# Altium footprint library MotorDriver.PcbLib: 29 footprints (part 2 of 2)
Each footprint in its own frame and in the unit in brackets; x right, y up, seen from the top. Pads: shape width x height; smd on the part's side, far side on the other; paste and mask are expansions set on the pad; w line width, h text height; cw(c..) or ccw(c..) is an arc to the next point about the centre after c.
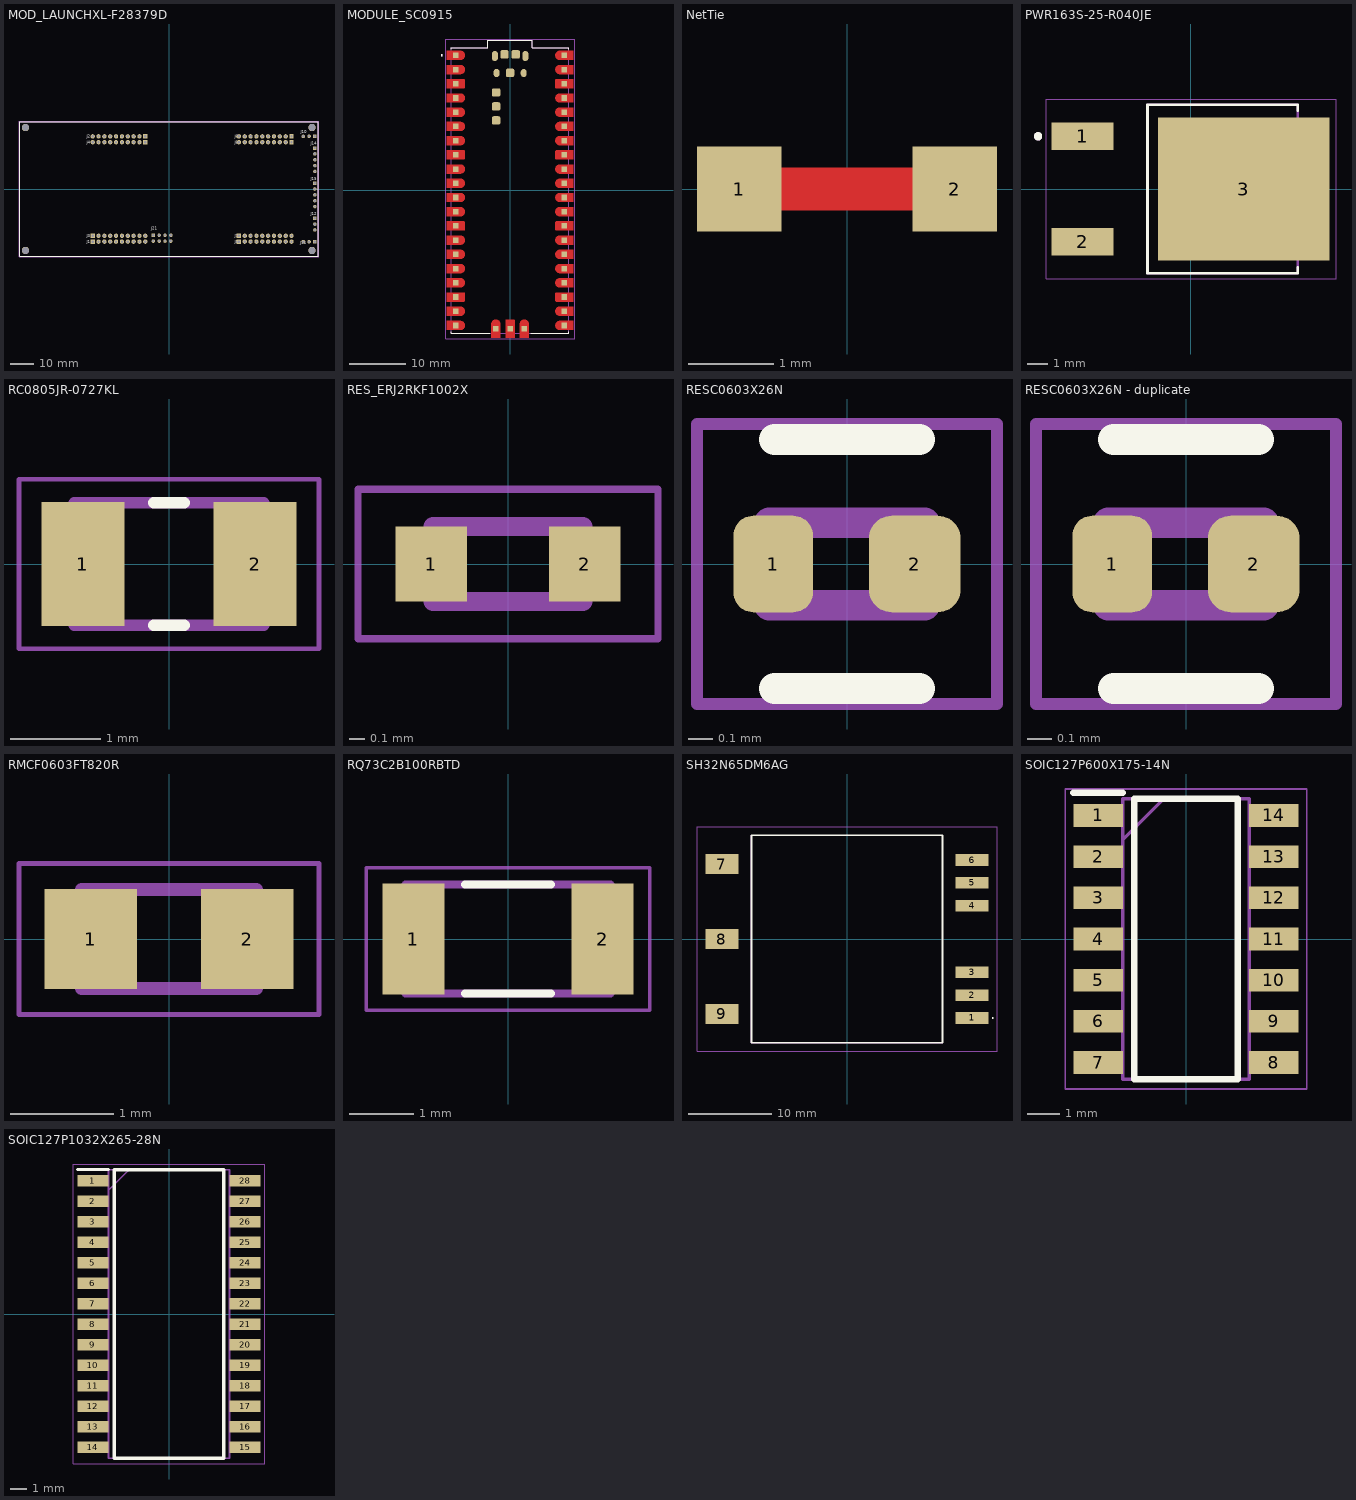
[diagram p1: the footprints below, top view; thin cyan lines are the x and y axes]

## MOD_LAUNCHXL-F28379D [mil]
pads (111):
  rect 74x74 hole 40: J1_1(-1305,-900) J2_1(-405,900) J3_1(-1305,-800) J4_1(-405,800) J5_1(1195,-900) J6_1(2095,900) J7_1(1195,-800) J8_1(2095,800)
  round 74 hole 40: J1_2(-1205,-900) J1_3(-1105,-900) J1_4(-1005,-900) J1_5(-905,-900) J1_6(-805,-900) J1_7(-705,-900) J1_8(-605,-900) J1_9(-505,-900) J1_10(-405,-900) J2_2(-505,900) J2_3(-605,900) J2_4(-705,900) J2_5(-805,900) J2_6(-905,900) J2_7(-1005,900) J2_8(-1105,900) J2_9(-1205,900) J2_10(-1305,900) J3_2(-1205,-800) J3_3(-1105,-800) J3_4(-1005,-800) J3_5(-905,-800) J3_6(-805,-800) J3_7(-705,-800) J3_8(-605,-800) J3_9(-505,-800) J3_10(-405,-800) J4_2(-505,800) J4_3(-605,800) J4_4(-705,800) J4_5(-805,800) J4_6(-905,800) J4_7(-1005,800) J4_8(-1105,800) J4_9(-1205,800) J4_10(-1305,800) J5_2(1295,-900) J5_3(1395,-900) J5_4(1495,-900) J5_5(1595,-900) J5_6(1695,-900) J5_7(1795,-900) J5_8(1895,-900) J5_9(1995,-900) J5_10(2095,-900) J6_2(1995,900) J6_3(1895,900) J6_4(1795,900) J6_5(1695,900) J6_6(1595,900) J6_7(1495,900) J6_8(1395,900) J6_9(1295,900) J6_10(1195,900) J7_2(1295,-800) J7_3(1395,-800) J7_4(1495,-800) J7_5(1595,-800) J7_6(1695,-800) J7_7(1795,-800) J7_8(1895,-800) J7_9(1995,-800) J7_10(2095,-800) J8_2(1995,800) J8_3(1895,800) J8_4(1795,800) J8_5(1695,800) J8_6(1595,800) J8_7(1495,800) J8_8(1395,800) J8_9(1295,800) J8_10(1195,800)
  rect 60x60 hole 40: J10_1(2495,900) J12_1(2495,-500) J14_1(2495,700) J15_1(2495,100) J16_1(2495,-900)
  round 60 hole 40: J10_2(2395,900) J10_3(2295,900) J12_2(2495,-600) J12_3(2495,-700) J14_2(2495,600) J14_3(2495,500) J14_4(2495,400) J14_5(2495,300) J15_2(2495,0) J15_3(2495,-100) J15_4(2495,-200) J15_5(2495,-300) J16_2(2395,-900) J16_3(2295,-900)
  rect 59.06x59.06 hole 39.37: J21_1(-267.83,-790.79)
  round 59.06 hole 39.37: J21_2(-267.83,-890.79) J21_3(-167.83,-790.79) J21_4(-167.83,-890.79) J21_5(-67.83,-790.79) J21_6(-67.83,-890.79) J21_7(32.17,-790.79) J21_8(32.17,-890.79)
  round 125 hole 125 unplated: ""(-2455,-1050) ""(-2455,1050) ""(2445,-1050) ""(2445,1050)
Top Overlay:
  lines w5: -2555,-1150 -2555,1150 2555,1150 2555,-1150 -2555,-1150
  text "J16" at 2241.26,-943.7 h50
  text "J12" at 2426.3,-446.26 h50
  text "J15" at 2426.3,153.74 h50
  text "J10" at 2251.1,956.89 h50
  text "J14" at 2424.33,760.04 h50
  text "J21" at -305,-700 h50
  text "J5" at 1120,-925 h50
  text "J7" at 1120,-825 h50
  text "J8" at 1120,775 h50
  text "J6" at 1120,875 h50
  text "J4" at -1405,775 h50
  text "J2" at -1405,875 h50
  text "J3" at -1405,-825 h50
  text "J1" at -1405,-925 h50
Mechanical 13:
  lines w5: -2555,-1150 2555,-1150 2555,1150 -2555,1150 -2555,-1150
Mechanical 15:
  lines w1.97: -2564.84,-1159.84 -2564.84,1159.84 2564.84,1159.84 2564.84,-1159.84 -2564.84,-1159.84
3D body "LAUNCHXL-F28379D--3DModel-STEP-56544.STEP": height 340.39, standoff -398.03, extent -2589.31,-1150 2560,1239.57

## MODULE_SC0915 [mm]
pads (53):
  rect 1x1 smd paste-1 mask+0: 1(-9.69,24.13) 2(-9.69,21.59) 3(-9.69,19.05) 4(-9.69,16.51) 5(-9.69,13.97) 6(-9.69,11.43) 7(-9.69,8.89) 8(-9.69,6.35) 9(-9.69,3.81) 10(-9.69,1.27) 11(-9.69,-1.27) 12(-9.69,-3.81) 13(-9.69,-6.35) 14(-9.69,-8.89) 15(-9.69,-11.43) 16(-9.69,-13.97) 17(-9.69,-16.51) 18(-9.69,-19.05) 19(-9.69,-21.59) 20(-9.69,-24.13) 21(9.69,-24.13) 22(9.69,-21.59) 23(9.69,-19.05) 24(9.69,-16.51) 25(9.69,-13.97) 26(9.69,-11.43) 27(9.69,-8.89) 28(9.69,-6.35) 29(9.69,-3.81) 30(9.69,-1.27) 31(9.69,1.27) 32(9.69,3.81) 33(9.69,6.35) 34(9.69,8.89) 35(9.69,11.43) 36(9.69,13.97) 37(9.69,16.51) 38(9.69,19.05) 39(9.69,21.59) 40(9.69,24.13) D1(-2.54,-24.7) D2(0,-24.7) D3(2.54,-24.7)
  oval 1.1x1.8 smd: A(-2.725,24) B(2.725,24)
  oval 1.05x1.45 smd: C(-2.425,20.97) D(2.425,20.97)
  rrect40% 1.5x1.5 smd: TP1(0,21) TP2(1,24.3) TP3(-1,24.3) TP4(-2.5,17.5) TP5(-2.5,15) TP6(-2.5,12.5)
Top Layer:
  drawing of 43 lines, arcs and shapes, not listed
Top Overlay:
  circle w0.2: c-12.19,24.13 r0.1
  lines w0.127: -10.5,-25.25 -10.5,-25.5 -3.66,-25.5 ; -10.5,25.25 -10.5,25.5 -4,25.5 -4,26.8 4,26.8 4,25.5 10.5,25.5 10.5,25.25 ; 3.66,-25.5 10.5,-25.5 10.5,-25.25
Top Paste:
  drawing of 43 lines, arcs and shapes, not listed
Top Solder:
  drawing of 43 lines, arcs and shapes, not listed
Mechanical 13:
  circle w0.2: c-12.19,24.13 r0.1
  lines w0.127: -10.5,-25.5 -10.5,25.5 -4,25.5 -4,26.8 4,26.8 4,25.5 10.5,25.5 10.5,-25.5 -10.5,-25.5
Mechanical 15:
  lines w0.05: -11.54,-26.55 -11.54,27.05 11.54,27.05 11.54,-26.55 -11.54,-26.55
3D body "step_temp.STEP": height 3.73, standoff 0, extent -10.5,-25.5 10.5,26.8

## NetTie [mm]
pads (2):
  rect 1x1 smd mask-10: 1(-1.27,0) 2(1.27,0)
Top Layer:
  rectangle: -1.016,-0.254 1.016,0.254

## PWR163S-25-R040JE [mm]
pads (3):
  rect 2.99x1.34 smd: 1(-5.2,2.54) 2(-5.2,-2.54)
  rect 8.26x6.9 smd paste-5: 3(2.56,0)
Top Overlay:
  circle w0.2: c-7.35,2.54 r0.1
  lines w0.127: 5.165,-3.77 5.165,-4.065 -2.075,-4.065 -2.075,4.065 5.165,4.065 5.165,3.77
Top Paste:
  region: 6.355,1.61 4.975,1.61 4.975,2.99 6.355,2.99
  region: 6.355,-2.99 4.975,-2.99 4.975,-1.61 6.355,-1.61
  region: 4.285,-2.99 2.905,-2.99 2.905,-1.61 4.285,-1.61
  region: 2.215,-2.99 0.835,-2.99 0.835,-1.61 2.215,-1.61
  region: 0.145,-2.99 -1.235,-2.99 -1.235,-1.61 0.145,-1.61
  region: 0.145,1.61 -1.235,1.61 -1.235,2.99 0.145,2.99
  region: 2.215,1.61 0.835,1.61 0.835,2.99 2.215,2.99
  region: 4.285,1.61 2.905,1.61 2.905,2.99 4.285,2.99
  region: 0.145,-0.69 -1.235,-0.69 -1.235,0.69 0.145,0.69
  region: 6.355,-0.69 4.975,-0.69 4.975,0.69 6.355,0.69
  region: 2.215,-0.69 0.835,-0.69 0.835,0.69 2.215,0.69
  region: 4.285,-0.69 2.905,-0.69 2.905,0.69 4.285,0.69
Mechanical 13:
  circle w0.2: c-7.35,2.54 r0.1
  lines w0.127: -2.075,-4.065 -2.075,4.065 5.165,4.065 5.165,-4.065 -2.075,-4.065
Mechanical 15:
  lines w0.05: -6.95,-4.315 -6.95,4.315 7.01,4.315 7.01,-4.315 -6.95,-4.315
3D body "pwr163.stp": height 2.79, standoff 0, extent -5.618,-3.938 6.632,4.192

## RC0805JR-0727KL [mm]
pads (2):
  rect 0.92x1.38 smd: 1(-0.955,0) 2(0.955,0)
Top Overlay:
  lines w0.127: -0.17,-0.68 0.17,-0.68 ; -0.17,0.68 0.17,0.68
Mechanical 13:
  lines w0.127: -1.05,-0.68 1.05,-0.68 1.05,0.68 -1.05,0.68 -1.05,-0.68
Mechanical 15:
  lines w0.05: -1.665,-0.94 1.665,-0.94 1.665,0.94 -1.665,0.94 -1.665,-0.94
3D body "RC0805JR-0727KL.STEP": height 0.6, standoff 0, extent -1,-0.625 1,0.625

## RES_ERJ2RKF1002X [mm]
pads (2):
  rect 0.475x0.5 smd: 1(-0.512,0) 2(0.512,0)
Mechanical 13:
  lines w0.127: -0.5,-0.25 0.5,-0.25 0.5,0.25 -0.5,0.25 -0.5,-0.25
Mechanical 15:
  lines w0.05: -1,-0.5 1,-0.5 1,0.5 -1,0.5 -1,-0.5
3D body "step_temp.STEP": height 0.35, standoff 0, extent -0.5,-0.25 0.5,0.25

## RESC0603X26N [mm]
pads (2):
  rrect50% 0.33x0.4 smd: 1(-0.305,0)
  rrect50% 0.38x0.4 smd: 2(0.28,0)
Top Overlay:
  lines w0.127: -0.3,-0.515 0.3,-0.515 ; -0.3,0.515 0.3,0.515
Mechanical 13:
  lines w0.127: -0.32,-0.17 0.32,-0.17 0.32,0.17 -0.32,0.17 -0.32,-0.17
Mechanical 15:
  lines w0.05: -0.62,-0.579 0.62,-0.579 0.62,0.579 -0.62,0.579 -0.62,-0.579
3D body "RC0201FR-0710KL--3DModel-STEP-510211.STEP": height 0.26, standoff 0, extent -0.3,-0.15 0.3,0.15

## RESC0603X26N - duplicate [mm]
pads (2):
  rrect50% 0.33x0.4 smd: 1(-0.305,0)
  rrect50% 0.38x0.4 smd: 2(0.28,0)
Top Overlay:
  lines w0.127: -0.3,-0.515 0.3,-0.515 ; -0.3,0.515 0.3,0.515
Mechanical 13:
  lines w0.127: -0.32,-0.17 -0.32,0.17 0.32,0.17 0.32,-0.17 -0.32,-0.17
Mechanical 15:
  lines w0.05: -0.62,-0.579 -0.62,0.579 0.62,0.579 0.62,-0.579 -0.62,-0.579
3D body "RC0201FR-0710KL--3DModel-STEP-510211.STEP": height 0.26, standoff 0, extent -0.3,-0.15 0.3,0.15

## RMCF0603FT820R [mm]
pads (2):
  rect 0.9x0.97 smd: 1(-0.76,0) 2(0.76,0)
Mechanical 13:
  lines w0.127: -0.85,-0.48 0.85,-0.48 0.85,0.48 -0.85,0.48 -0.85,-0.48
Mechanical 15:
  lines w0.05: -1.46,-0.735 1.46,-0.735 1.46,0.735 -1.46,0.735 -1.46,-0.735
3D body "RMCF0603FT820R.STEP": height 0.55, standoff 0, extent -0.775,-0.4 0.775,0.4

## RQ73C2B100RBTD [mm]
pads (2):
  rect 0.97x1.73 smd: 1(-1.48,0) 2(1.48,0)
Top Overlay:
  lines w0.127: -0.67,-0.85 0.67,-0.85 ; -0.67,0.85 0.67,0.85
Mechanical 13:
  lines w0.127: -1.6,-0.85 -1.6,0.85 1.6,0.85 1.6,-0.85 -1.6,-0.85
Mechanical 15:
  lines w0.05: -2.215,-1.115 -2.215,1.115 2.215,1.115 2.215,-1.115 -2.215,-1.115
3D body "RQ73C2B100RBTD.STEP": height 0.75, standoff 0, extent -1.55,-0.8 1.55,0.8

## SH32N65DM6AG [mm]
pads (9):
  rect 4x1.4 smd: 1(15.05,-9.5) 2(15.05,-6.75) 3(15.05,-4) 4(15.05,4) 5(15.05,6.75) 6(15.05,9.5)
  rect 4x2.4 smd: 7(-15.05,9) 8(-15.05,0) 9(-15.05,-9)
Top Overlay:
  lines w0.1: 17.5,-9.5 cw(c17.55,-9.5) 17.6,-9.5 cw(c17.55,-9.5) 17.5,-9.5
  lines w0.2: -11.5,-12.5 11.5,-12.5 11.5,12.5 -11.5,12.5 -11.5,-12.5
Mechanical 15:
  lines w0.1: -11.5,-12.5 11.5,-12.5 11.5,12.5 -11.5,12.5 -11.5,-12.5
Mechanical 20:
  lines w0.1: -18.05,-13.5 18.05,-13.5 18.05,13.5 -18.05,13.5 -18.05,-13.5
3D body "SH32N65DM6AG.stp": height 5.5, standoff -0.01, extent -16.223,-12.373 16.477,12.627

## SOIC127P600X175-14N [mm]
pads (14):
  rect 1.525x0.7 smd: 1(-2.712,3.81) 2(-2.712,2.54) 3(-2.712,1.27) 4(-2.712,0) 5(-2.712,-1.27) 6(-2.712,-2.54) 7(-2.712,-3.81) 8(2.712,-3.81) 9(2.712,-2.54) 10(2.712,-1.27) 11(2.712,0) 12(2.712,1.27) 13(2.712,2.54) 14(2.712,3.81)
Top Overlay:
  lines w0.2: -3.475,4.51 -1.95,4.51 ; -1.6,-4.325 1.6,-4.325 1.6,4.325 -1.6,4.325 -1.6,-4.325
Mechanical 13:
  lines w0.1: -1.95,3.055 -0.68,4.325 ; -1.95,-4.325 1.95,-4.325 1.95,4.325 -1.95,4.325 -1.95,-4.325
Mechanical 15:
  lines w0.05: -3.725,-4.625 3.725,-4.625 3.725,4.625 -3.725,4.625 -3.725,-4.625
3D body "L6491D.stp": height 1.75, standoff 0, extent -3,-4.325 3,4.325

## SOIC127P1032X265-28N [mm]
pads (28):
  rect 1.925x0.7 smd: 1(-4.712,8.255) 2(-4.712,6.985) 3(-4.712,5.715) 4(-4.712,4.445) 5(-4.712,3.175) 6(-4.712,1.905) 7(-4.712,0.635) 8(-4.712,-0.635) 9(-4.712,-1.905) 10(-4.712,-3.175) 11(-4.712,-4.445) 12(-4.712,-5.715) 13(-4.712,-6.985) 14(-4.712,-8.255) 15(4.712,-8.255) 16(4.712,-6.985) 17(4.712,-5.715) 18(4.712,-4.445) 19(4.712,-3.175) 20(4.712,-1.905) 21(4.712,-0.635) 22(4.712,0.635) 23(4.712,1.905) 24(4.712,3.175) 25(4.712,4.445) 26(4.712,5.715) 27(4.712,6.985) 28(4.712,8.255)
Top Overlay:
  lines w0.2: -5.675,8.955 -3.75,8.955 ; -3.4,-8.95 -3.4,8.95 3.4,8.95 3.4,-8.95 -3.4,-8.95
Mechanical 15:
  lines w0.1: -3.75,7.68 -2.48,8.95 ; -3.75,-8.95 -3.75,8.95 3.75,8.95 3.75,-8.95 -3.75,-8.95
Mechanical 20:
  lines w0.05: -5.925,-9.3 -5.925,9.3 5.925,9.3 5.925,-9.3 -5.925,-9.3
3D body "STDRIVE601.stp": height 2.65, standoff 0, extent -5.162,-8.95 5.162,8.95